# Altium schematic symbol library Regulator_Switching.SchLib: 1120 symbols (part 7 of 8) (continued)
## TPS61092 (continued)
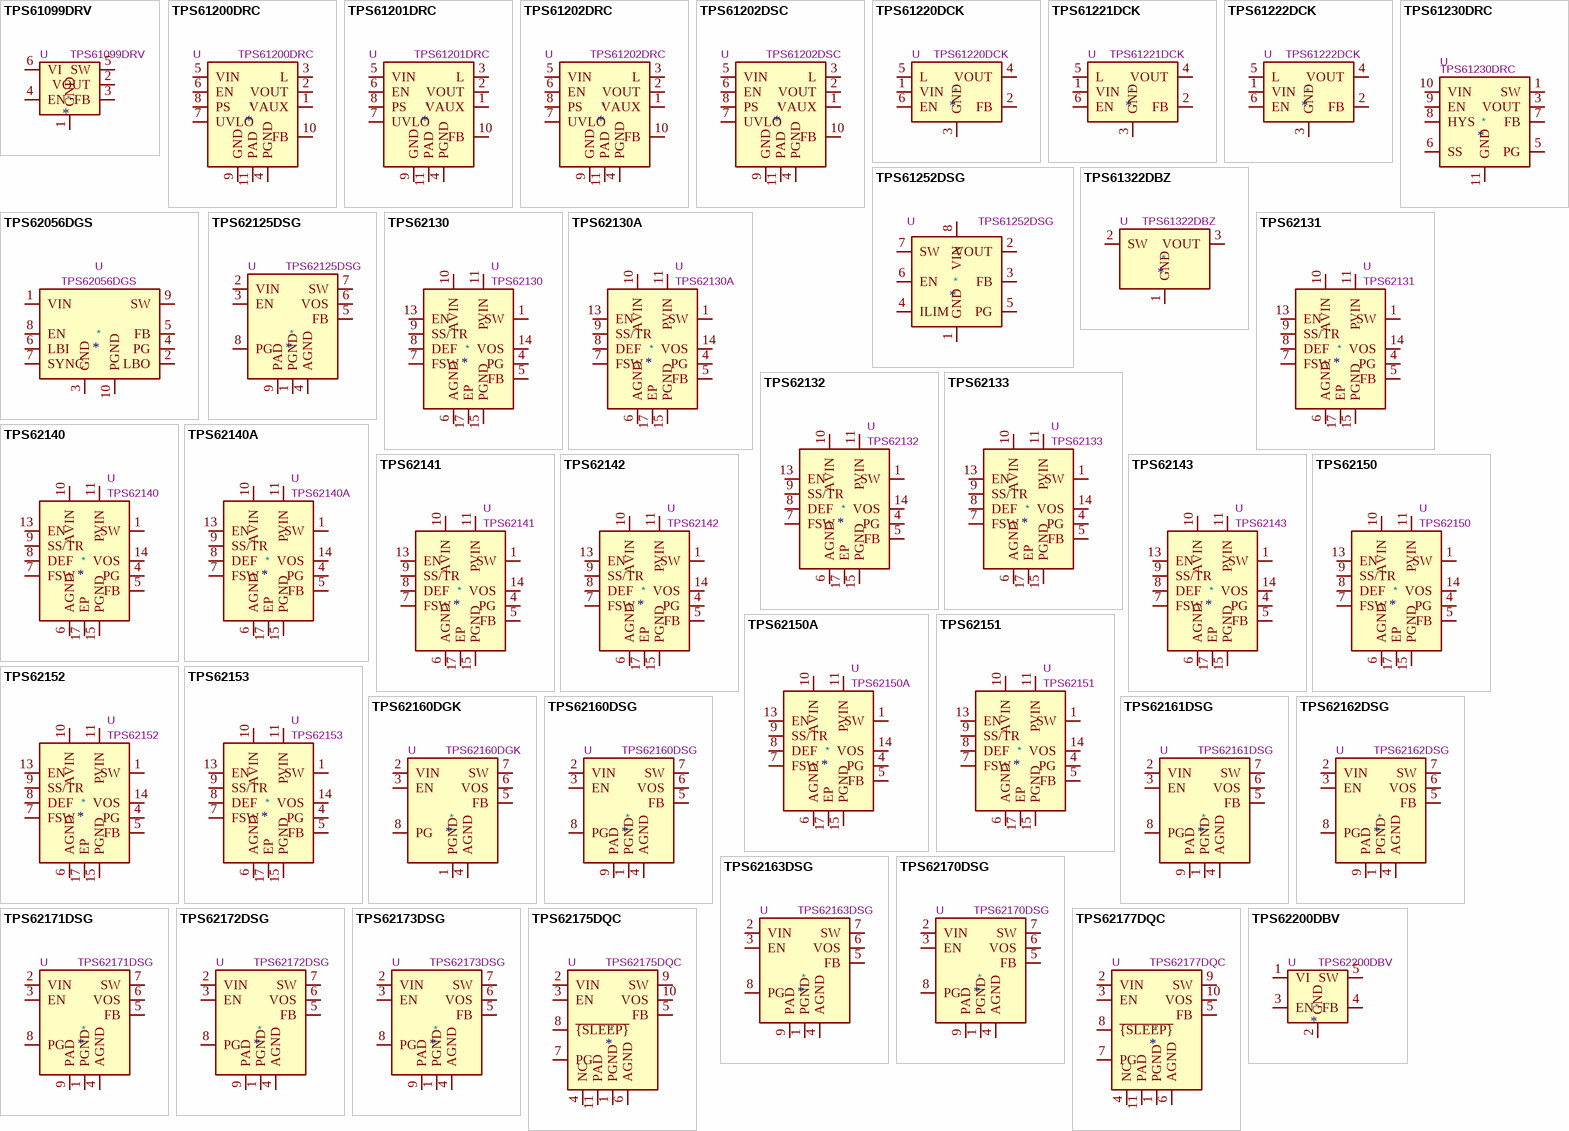
[diagram p25: symbols TPS61099DRV to TPS62200DBV]

## TPS61099DRV
designator *  value TPS61099DRV  Reference: U
ki_keywords: Step-Up DC-DC Converter; ki_description: Boost Converter, 0.7-5.5V Input Voltage, 1A Switch Current, Adjustable 1.8-5.5V Output Voltage, WSON-6; ki_fp_filters: WSON*1EP*2x2mm*P0.65mm*; Footprint: Package_SON:WSON-6-1EP_2x2mm_P0.65mm_EP1x1.6mm; Datasheet: https://www.ti.com/lit/gpn/TPS61099
pins: 1 GND, 2 VOUT, 3 FB, 4 EN, 5 SW, 6 VI, 7 GND hidden

## TPS61200DRC
designator *  value TPS61200DRC  Reference: U
ki_keywords: boost step-up DC/DC synchronous; ki_description: Low Input Voltage Synchronous Boost Converter With 1.3A Switches, Adjustable Output Voltage, 0.3-5.5V Input Voltage, VSON-10; ki_fp_filters: Texas*S*PVSON*N10*ThermalVias*; Footprint: Package_SON:Texas_S-PVSON-N10_ThermalVias; Datasheet: http://www.ti.com/lit/ds/symlink/tps61200.pdf
pins: 1 VAUX, 2 VOUT, 3 L, 4 PGND, 5 VIN, 6 EN, 7 UVLO, 8 PS, 9 GND, 10 FB, 11 PAD

## TPS61201DRC
designator *  value TPS61201DRC  Reference: U
ki_keywords: boost step-up DC/DC synchronous; ki_description: Low Input Voltage Synchronous Boost Converter With 1.3A Switches, Fixed 5V Output Voltage, 0.3-5.5V Input Voltage, VSON-10; ki_fp_filters: Texas*S*PVSON*N10*ThermalVias*; Footprint: Package_SON:Texas_S-PVSON-N10_ThermalVias; Datasheet: http://www.ti.com/lit/ds/symlink/tps61200.pdf
pins: 1 VAUX, 2 VOUT, 3 L, 4 PGND, 5 VIN, 6 EN, 7 UVLO, 8 PS, 9 GND, 10 FB, 11 PAD

## TPS61202DRC
designator *  value TPS61202DRC  Reference: U
ki_keywords: boost step-up DC/DC synchronous; ki_description: Low Input Voltage Synchronous Boost Converter With 1.3A Switches, Fixed 5V Output Voltage, 0.3-5.5V Input Voltage, VSON-10; ki_fp_filters: Texas*S*PVSON*N10*ThermalVias*; Footprint: Package_SON:Texas_S-PVSON-N10_ThermalVias; Datasheet: http://www.ti.com/lit/ds/symlink/tps61200.pdf
pins: 1 VAUX, 2 VOUT, 3 L, 4 PGND, 5 VIN, 6 EN, 7 UVLO, 8 PS, 9 GND, 10 FB, 11 PAD

## TPS61202DSC
designator *  value TPS61202DSC  Reference: U
ki_keywords: boost step-up DC/DC synchronous; ki_description: Low Input Voltage Synchronous Boost Converter With 1.3A Switches, Fixed 5V Output Voltage, 0.3-5.5V Input Voltage, WSON-10; ki_fp_filters: Texas*DSC0010J*ThermalVias*; Footprint: Package_SON:Texas_DSC0010J_ThermalVias; Datasheet: http://www.ti.com/lit/ds/symlink/tps61200.pdf
pins: 1 VAUX, 2 VOUT, 3 L, 4 PGND, 5 VIN, 6 EN, 7 UVLO, 8 PS, 9 GND, 10 FB, 11 PAD

## TPS61220DCK
designator *  value TPS61220DCK  Reference: U
ki_keywords: Boost adjustable converter; ki_description: 400 mA Step-Up Converter, Adjustable Output Voltage, 0.7-5.5V Input Voltage, SC-70; ki_fp_filters: Texas*R*PDSO*G6*; Footprint: Package_TO_SOT_SMD:Texas_R-PDSO-G6; Datasheet: http://www.ti.com/lit/ds/symlink/tps61220.pdf
pins: 1 VIN, 2 FB, 3 GND, 4 VOUT, 5 L, 6 EN

## TPS61221DCK
designator *  value TPS61221DCK  Reference: U
ki_keywords: Boost adjustable converter; ki_description: 400 mA Step-Up Converter, Fixed 3.3V Output Voltage, 0.7-5.5V Input Voltage, SC-70; ki_fp_filters: Texas*R*PDSO*G6*; Footprint: Package_TO_SOT_SMD:Texas_R-PDSO-G6; Datasheet: http://www.ti.com/lit/ds/symlink/tps61220.pdf
pins: 1 VIN, 2 FB, 3 GND, 4 VOUT, 5 L, 6 EN

## TPS61222DCK
designator *  value TPS61222DCK  Reference: U
ki_keywords: Boost adjustable converter; ki_description: 400 mA Step-Up Converter, Fixed 5V Output Voltage, 0.7-5.5V Input Voltage, SC-70; ki_fp_filters: Texas*R*PDSO*G6*; Footprint: Package_TO_SOT_SMD:Texas_R-PDSO-G6; Datasheet: http://www.ti.com/lit/ds/symlink/tps61220.pdf
pins: 1 VIN, 2 FB, 3 GND, 4 VOUT, 5 L, 6 EN

## TPS61230DRC
designator *  value TPS61230DRC  Reference: U
ki_keywords: boost converter switching adjustable 5A-switch VSON-10; ki_description: High Efficiency Synchronous Step Up Converters with 5-A Switches, 2.3-5.5V Input Voltage, VSON-10; ki_fp_filters: Texas*S*PVSON*N10*; Footprint: Package_SON:Texas_S-PVSON-N10_ThermalVias; Datasheet: http://www.ti.com/lit/ds/symlink/tps61232.pdf
pins: 1 SW, 2 SW hidden, 3 VOUT, 4 VOUT hidden, 5 PG, 6 SS, 7 FB, 8 HYS, 9 EN, 10 VIN, 11 GND

## TPS61252DSG
designator *  value TPS61252DSG  Reference: U
ki_keywords: boost converter switching; ki_description: Tiny 1.5-A Boost Converter With Adjustable Input Current Limit, 2.3-6.0V Vin, 3.0-6.5V Vout, WSON-8; ki_fp_filters: WSON*1EP*2x2mm*P0.5mm*; Footprint: Package_SON:WSON-8-1EP_2x2mm_P0.5mm_EP0.9x1.6mm; Datasheet: http://www.ti.com/lit/ds/symlink/tps61252.pdf
pins: 1 GND, 2 VOUT, 3 FB, 4 ILIM, 5 PG, 6 EN, 7 SW, 8 VIN, 9 GND hidden

## TPS61322DBZ
designator *  value TPS61322DBZ  Reference: U
ki_keywords: Boost converter; ki_description: 750mA Step-Up Converter, 2.2V Output Voltage, 0.9-5.5V Input Voltage, SOT-23; ki_fp_filters: SOT?23*; Footprint: Package_TO_SOT_SMD:SOT-23; Datasheet: http://www.ti.com/lit/ds/symlink/tps61322.pdf
pins: 1 GND, 2 SW, 3 VOUT

## TPS62056DGS
designator *  value TPS62056DGS  Reference: U
ki_keywords: voltage regulator switch mode step down; ki_description: 800 mA Step-Down Converter, Adjustable Output Voltage, 0.7-6V Input Voltage, VSSOP-10; ki_fp_filters: VSSOP*3x3mm*P0.5mm*; Footprint: Package_SO:VSSOP-10_3x3mm_P0.5mm; Datasheet: http://www.ti.com/lit/ds/symlink/tps62056.pdf
pins: 1 VIN, 2 LBO, 3 GND, 4 PG, 5 FB, 6 LBI, 7 SYNC, 8 EN, 9 SW, 10 PGND

## TPS62125DSG
designator *  value TPS62125DSG  Reference: U
ki_keywords: step-down dc-dc buck regulator; ki_description: 300mA Step-Down Converter with Enable Threshold and Hysteresis, adjustable output, 3-17V input voltage, WSON-8; ki_fp_filters: WSON*EP*2x2mm*P0.5mm*; Footprint: Package_SON:WSON-8-1EP_2x2mm_P0.5mm_EP0.9x1.6mm_ThermalVias; Datasheet: http://www.ti.com/lit/ds/symlink/tps62125.pdf
pins: 1 PGND, 2 VIN, 3 EN, 4 AGND, 5 FB, 6 VOS, 7 SW, 8 PG, 9 PAD

## TPS62130
designator *  value TPS62130  Reference: U
ki_keywords: step-down dcdc; ki_description: 3A Step-Down Converter with DCS-Control, Adjustable Output Voltage, 3-17V Input Voltage, QFN-16; ki_fp_filters: VQFN*1EP*3x3mm*P0.5mm*; Footprint: Package_DFN_QFN:VQFN-16-1EP_3x3mm_P0.5mm_EP1.68x1.68mm_ThermalVias; Datasheet: http://www.ti.com/lit/ds/symlink/tps62130.pdf
pins: 1 SW, 2 SW hidden, 3 SW hidden, 4 PG, 5 FB, 6 AGND, 7 FSW, 8 DEF, 9 SS/TR, 10 AVIN, 11 PVIN, 12 PVIN hidden, 13 EN, 14 VOS, 15 PGND, 16 PGND hidden, 17 EP

## TPS62130A
designator *  value TPS62130A  Reference: U
ki_keywords: step-down dcdc; ki_description: 3A Step-Down Converter with DCS-Control, Adjustable Output Voltage, 3-17V Input Voltage, PG=LOW in Power-Down, QFN-16; ki_fp_filters: VQFN*1EP*3x3mm*P0.5mm*; Footprint: Package_DFN_QFN:VQFN-16-1EP_3x3mm_P0.5mm_EP1.68x1.68mm_ThermalVias; Datasheet: http://www.ti.com/lit/ds/symlink/tps62130.pdf
pins: 1 SW, 2 SW hidden, 3 SW hidden, 4 PG, 5 FB, 6 AGND, 7 FSW, 8 DEF, 9 SS/TR, 10 AVIN, 11 PVIN, 12 PVIN hidden, 13 EN, 14 VOS, 15 PGND, 16 PGND hidden, 17 EP

## TPS62131
designator *  value TPS62131  Reference: U
ki_keywords: step-down dcdc; ki_description: 3A Step-Down Converter with DCS-Control, Fixed 1.8V Output Voltage, 3-17V Input Voltage, QFN-16; ki_fp_filters: VQFN*1EP*3x3mm*P0.5mm*; Footprint: Package_DFN_QFN:VQFN-16-1EP_3x3mm_P0.5mm_EP1.68x1.68mm_ThermalVias; Datasheet: http://www.ti.com/lit/ds/symlink/tps62130.pdf
pins: 1 SW, 2 SW hidden, 3 SW hidden, 4 PG, 5 FB, 6 AGND, 7 FSW, 8 DEF, 9 SS/TR, 10 AVIN, 11 PVIN, 12 PVIN hidden, 13 EN, 14 VOS, 15 PGND, 16 PGND hidden, 17 EP

## TPS62132
designator *  value TPS62132  Reference: U
ki_keywords: step-down dcdc; ki_description: 3A Step-Down Converter with DCS-Control, Fixed 3.3V Output Voltage, 3-17V Input Voltage, QFN-16; ki_fp_filters: VQFN*1EP*3x3mm*P0.5mm*; Footprint: Package_DFN_QFN:VQFN-16-1EP_3x3mm_P0.5mm_EP1.68x1.68mm_ThermalVias; Datasheet: http://www.ti.com/lit/ds/symlink/tps62130.pdf
pins: 1 SW, 2 SW hidden, 3 SW hidden, 4 PG, 5 FB, 6 AGND, 7 FSW, 8 DEF, 9 SS/TR, 10 AVIN, 11 PVIN, 12 PVIN hidden, 13 EN, 14 VOS, 15 PGND, 16 PGND hidden, 17 EP

## TPS62133
designator *  value TPS62133  Reference: U
ki_keywords: step-down dcdc; ki_description: 3A Step-Down Converter with DCS-Control, Fixed 5.0V Output Voltage, 3-17V Input Voltage, QFN-16; ki_fp_filters: VQFN*1EP*3x3mm*P0.5mm*; Footprint: Package_DFN_QFN:VQFN-16-1EP_3x3mm_P0.5mm_EP1.68x1.68mm_ThermalVias; Datasheet: http://www.ti.com/lit/ds/symlink/tps62130.pdf
pins: 1 SW, 2 SW hidden, 3 SW hidden, 4 PG, 5 FB, 6 AGND, 7 FSW, 8 DEF, 9 SS/TR, 10 AVIN, 11 PVIN, 12 PVIN hidden, 13 EN, 14 VOS, 15 PGND, 16 PGND hidden, 17 EP

## TPS62140
designator *  value TPS62140  Reference: U
ki_keywords: step-down dcdc; ki_description: 2A Step-Down Converter with DCS-Control, Adjustable Output Voltage, 3-17V Input Voltage, QFN-16; ki_fp_filters: VQFN*1EP*3x3mm*P0.5mm*; Footprint: Package_DFN_QFN:VQFN-16-1EP_3x3mm_P0.5mm_EP1.68x1.68mm_ThermalVias; Datasheet: http://www.ti.com/lit/ds/symlink/TPS62140.pdf
pins: 1 SW, 2 SW hidden, 3 SW hidden, 4 PG, 5 FB, 6 AGND, 7 FSW, 8 DEF, 9 SS/TR, 10 AVIN, 11 PVIN, 12 PVIN hidden, 13 EN, 14 VOS, 15 PGND, 16 PGND hidden, 17 EP

## TPS62140A
designator *  value TPS62140A  Reference: U
ki_keywords: step-down dcdc; ki_description: 2A Step-Down Converter with DCS-Control, Adjustable Output Voltage, 3-17V Input Voltage, PG=LOW in Power-Down, QFN-16; ki_fp_filters: VQFN*1EP*3x3mm*P0.5mm*; Footprint: Package_DFN_QFN:VQFN-16-1EP_3x3mm_P0.5mm_EP1.68x1.68mm_ThermalVias; Datasheet: http://www.ti.com/lit/ds/symlink/TPS62140.pdf
pins: 1 SW, 2 SW hidden, 3 SW hidden, 4 PG, 5 FB, 6 AGND, 7 FSW, 8 DEF, 9 SS/TR, 10 AVIN, 11 PVIN, 12 PVIN hidden, 13 EN, 14 VOS, 15 PGND, 16 PGND hidden, 17 EP

## TPS62141
designator *  value TPS62141  Reference: U
ki_keywords: step-down dcdc; ki_description: 2A Step-Down Converter with DCS-Control, Fixed 1.8V Output Voltage, 3-17V Input Voltage, QFN-16; ki_fp_filters: VQFN*1EP*3x3mm*P0.5mm*; Footprint: Package_DFN_QFN:VQFN-16-1EP_3x3mm_P0.5mm_EP1.68x1.68mm_ThermalVias; Datasheet: http://www.ti.com/lit/ds/symlink/TPS62140.pdf
pins: 1 SW, 2 SW hidden, 3 SW hidden, 4 PG, 5 FB, 6 AGND, 7 FSW, 8 DEF, 9 SS/TR, 10 AVIN, 11 PVIN, 12 PVIN hidden, 13 EN, 14 VOS, 15 PGND, 16 PGND hidden, 17 EP

## TPS62142
designator *  value TPS62142  Reference: U
ki_keywords: step-down dcdc; ki_description: 2A Step-Down Converter with DCS-Control, Fixed 3.3V Output Voltage, 3-17V Input Voltage, QFN-16; ki_fp_filters: VQFN*1EP*3x3mm*P0.5mm*; Footprint: Package_DFN_QFN:VQFN-16-1EP_3x3mm_P0.5mm_EP1.68x1.68mm_ThermalVias; Datasheet: http://www.ti.com/lit/ds/symlink/TPS62140.pdf
pins: 1 SW, 2 SW hidden, 3 SW hidden, 4 PG, 5 FB, 6 AGND, 7 FSW, 8 DEF, 9 SS/TR, 10 AVIN, 11 PVIN, 12 PVIN hidden, 13 EN, 14 VOS, 15 PGND, 16 PGND hidden, 17 EP

## TPS62143
designator *  value TPS62143  Reference: U
ki_keywords: step-down dcdc; ki_description: 2A Step-Down Converter with DCS-Control, Fixed 5.0V Output Voltage, 3-17V Input Voltage, QFN-16; ki_fp_filters: VQFN*1EP*3x3mm*P0.5mm*; Footprint: Package_DFN_QFN:VQFN-16-1EP_3x3mm_P0.5mm_EP1.68x1.68mm_ThermalVias; Datasheet: http://www.ti.com/lit/ds/symlink/TPS62140.pdf
pins: 1 SW, 2 SW hidden, 3 SW hidden, 4 PG, 5 FB, 6 AGND, 7 FSW, 8 DEF, 9 SS/TR, 10 AVIN, 11 PVIN, 12 PVIN hidden, 13 EN, 14 VOS, 15 PGND, 16 PGND hidden, 17 EP

## TPS62150
designator *  value TPS62150  Reference: U
ki_keywords: step-down dcdc; ki_description: 1A Step-Down Converter with DCS-Control, Adjustable Output Voltage, 3-17V Input Voltage, QFN-16; ki_fp_filters: VQFN*1EP*3x3mm*P0.5mm*; Footprint: Package_DFN_QFN:VQFN-16-1EP_3x3mm_P0.5mm_EP1.68x1.68mm_ThermalVias; Datasheet: http://www.ti.com/lit/ds/symlink/TPS62150.pdf
pins: 1 SW, 2 SW hidden, 3 SW hidden, 4 PG, 5 FB, 6 AGND, 7 FSW, 8 DEF, 9 SS/TR, 10 AVIN, 11 PVIN, 12 PVIN hidden, 13 EN, 14 VOS, 15 PGND, 16 PGND hidden, 17 EP

## TPS62150A
designator *  value TPS62150A  Reference: U
ki_keywords: step-down dcdc; ki_description: 1A Step-Down Converter with DCS-Control, Adjustable Output Voltage, 3-17V Input Voltage, PG=LOW in Power-Down, QFN-16; ki_fp_filters: VQFN*1EP*3x3mm*P0.5mm*; Footprint: Package_DFN_QFN:VQFN-16-1EP_3x3mm_P0.5mm_EP1.68x1.68mm_ThermalVias; Datasheet: http://www.ti.com/lit/ds/symlink/TPS62150.pdf
pins: 1 SW, 2 SW hidden, 3 SW hidden, 4 PG, 5 FB, 6 AGND, 7 FSW, 8 DEF, 9 SS/TR, 10 AVIN, 11 PVIN, 12 PVIN hidden, 13 EN, 14 VOS, 15 PGND, 16 PGND hidden, 17 EP

## TPS62151
designator *  value TPS62151  Reference: U
ki_keywords: step-down dcdc; ki_description: 1A Step-Down Converter with DCS-Control, Fixed 1.8V Output Voltage, 3-17V Input Voltage, QFN-16; ki_fp_filters: VQFN*1EP*3x3mm*P0.5mm*; Footprint: Package_DFN_QFN:VQFN-16-1EP_3x3mm_P0.5mm_EP1.68x1.68mm_ThermalVias; Datasheet: http://www.ti.com/lit/ds/symlink/TPS62150.pdf
pins: 1 SW, 2 SW hidden, 3 SW hidden, 4 PG, 5 FB, 6 AGND, 7 FSW, 8 DEF, 9 SS/TR, 10 AVIN, 11 PVIN, 12 PVIN hidden, 13 EN, 14 VOS, 15 PGND, 16 PGND hidden, 17 EP

## TPS62152
designator *  value TPS62152  Reference: U
ki_keywords: step-down dcdc; ki_description: 1A Step-Down Converter with DCS-Control, Fixed 3.3V Output Voltage, 3-17V Input Voltage, QFN-16; ki_fp_filters: VQFN*1EP*3x3mm*P0.5mm*; Footprint: Package_DFN_QFN:VQFN-16-1EP_3x3mm_P0.5mm_EP1.68x1.68mm_ThermalVias; Datasheet: http://www.ti.com/lit/ds/symlink/TPS62150.pdf
pins: 1 SW, 2 SW hidden, 3 SW hidden, 4 PG, 5 FB, 6 AGND, 7 FSW, 8 DEF, 9 SS/TR, 10 AVIN, 11 PVIN, 12 PVIN hidden, 13 EN, 14 VOS, 15 PGND, 16 PGND hidden, 17 EP

## TPS62153
designator *  value TPS62153  Reference: U
ki_keywords: step-down dcdc; ki_description: 1A Step-Down Converter with DCS-Control, Fixed 5.0V Output Voltage, 3-17V Input Voltage, QFN-16; ki_fp_filters: VQFN*1EP*3x3mm*P0.5mm*; Footprint: Package_DFN_QFN:VQFN-16-1EP_3x3mm_P0.5mm_EP1.68x1.68mm_ThermalVias; Datasheet: http://www.ti.com/lit/ds/symlink/TPS62150.pdf
pins: 1 SW, 2 SW hidden, 3 SW hidden, 4 PG, 5 FB, 6 AGND, 7 FSW, 8 DEF, 9 SS/TR, 10 AVIN, 11 PVIN, 12 PVIN hidden, 13 EN, 14 VOS, 15 PGND, 16 PGND hidden, 17 EP

## TPS62160DGK
designator *  value TPS62160DGK  Reference: U
ki_keywords: step-down dc-dc buck regulator; ki_description: 1A Step-Down Converter with DCS-Control, adjustable output, 3-17V input voltage, VSSOP-8; ki_fp_filters: MSOP*3x3mm*P0.65mm*; Footprint: Package_SO:MSOP-8_3x3mm_P0.65mm; Datasheet: http://www.ti.com/lit/ds/symlink/tps62160.pdf
pins: 1 PGND, 2 VIN, 3 EN, 4 AGND, 5 FB, 6 VOS, 7 SW, 8 PG

## TPS62160DSG
designator *  value TPS62160DSG  Reference: U
ki_keywords: step-down dc-dc buck regulator; ki_description: 1A Step-Down Converter with DCS-Control, adjustable output, 3-17V input voltage, WSON-8; ki_fp_filters: WSON*EP*2x2mm*P0.5mm*; Footprint: Package_SON:WSON-8-1EP_2x2mm_P0.5mm_EP0.9x1.6mm_ThermalVias; Datasheet: http://www.ti.com/lit/ds/symlink/tps62160.pdf
pins: 1 PGND, 2 VIN, 3 EN, 4 AGND, 5 FB, 6 VOS, 7 SW, 8 PG, 9 PAD

## TPS62161DSG
designator *  value TPS62161DSG  Reference: U
ki_keywords: step-down dc-dc buck regulator; ki_description: 1A Step-Down Converter with DCS-Control, fixed 1.8V output, 3-17V input voltage, WSON-8; ki_fp_filters: WSON*EP*2x2mm*P0.5mm*; Footprint: Package_SON:WSON-8-1EP_2x2mm_P0.5mm_EP0.9x1.6mm_ThermalVias; Datasheet: http://www.ti.com/lit/ds/symlink/tps62160.pdf
pins: 1 PGND, 2 VIN, 3 EN, 4 AGND, 5 FB, 6 VOS, 7 SW, 8 PG, 9 PAD

## TPS62162DSG
designator *  value TPS62162DSG  Reference: U
ki_keywords: step-down dc-dc buck regulator; ki_description: 1A Step-Down Converter with DCS-Control, fixed 3.3V output, 3-17V input voltage, WSON-8; ki_fp_filters: WSON*EP*2x2mm*P0.5mm*; Footprint: Package_SON:WSON-8-1EP_2x2mm_P0.5mm_EP0.9x1.6mm_ThermalVias; Datasheet: http://www.ti.com/lit/ds/symlink/tps62160.pdf
pins: 1 PGND, 2 VIN, 3 EN, 4 AGND, 5 FB, 6 VOS, 7 SW, 8 PG, 9 PAD

## TPS62163DSG
designator *  value TPS62163DSG  Reference: U
ki_keywords: step-down dc-dc buck regulator; ki_description: 1A Step-Down Converter with DCS-Control, fixed 5.0V output, 3-17V input voltage, WSON-8; ki_fp_filters: WSON*EP*2x2mm*P0.5mm*; Footprint: Package_SON:WSON-8-1EP_2x2mm_P0.5mm_EP0.9x1.6mm_ThermalVias; Datasheet: http://www.ti.com/lit/ds/symlink/tps62160.pdf
pins: 1 PGND, 2 VIN, 3 EN, 4 AGND, 5 FB, 6 VOS, 7 SW, 8 PG, 9 PAD

## TPS62170DSG
designator *  value TPS62170DSG  Reference: U
ki_keywords: step-down dc-dc buck regulator; ki_description: 500mA Step-Down Converter with DCS-Control, adjustable output, 3-17V input voltage, WSON-8; ki_fp_filters: WSON*EP*2x2mm*P0.5mm*; Footprint: Package_SON:WSON-8-1EP_2x2mm_P0.5mm_EP0.9x1.6mm_ThermalVias; Datasheet: http://www.ti.com/lit/ds/symlink/tps62170.pdf
pins: 1 PGND, 2 VIN, 3 EN, 4 AGND, 5 FB, 6 VOS, 7 SW, 8 PG, 9 PAD

## TPS62171DSG
designator *  value TPS62171DSG  Reference: U
ki_keywords: step-down dc-dc buck regulator; ki_description: 500mA Step-Down Converter with DCS-Control, fixed 1.8V output, 3-17V input voltage, WSON-8; ki_fp_filters: WSON*EP*2x2mm*P0.5mm*; Footprint: Package_SON:WSON-8-1EP_2x2mm_P0.5mm_EP0.9x1.6mm_ThermalVias; Datasheet: http://www.ti.com/lit/ds/symlink/tps62170.pdf
pins: 1 PGND, 2 VIN, 3 EN, 4 AGND, 5 FB, 6 VOS, 7 SW, 8 PG, 9 PAD

## TPS62172DSG
designator *  value TPS62172DSG  Reference: U
ki_keywords: step-down dc-dc buck regulator; ki_description: 500mA Step-Down Converter with DCS-Control, fixed 3.3V output, 3-17V input voltage, WSON-8; ki_fp_filters: WSON*EP*2x2mm*P0.5mm*; Footprint: Package_SON:WSON-8-1EP_2x2mm_P0.5mm_EP0.9x1.6mm_ThermalVias; Datasheet: http://www.ti.com/lit/ds/symlink/tps62170.pdf
pins: 1 PGND, 2 VIN, 3 EN, 4 AGND, 5 FB, 6 VOS, 7 SW, 8 PG, 9 PAD

## TPS62173DSG
designator *  value TPS62173DSG  Reference: U
ki_keywords: step-down dc-dc buck regulator; ki_description: 500mA Step-Down Converter with DCS-Control, fixed 5.0V output, 3-17V input voltage, WSON-8; ki_fp_filters: WSON*EP*2x2mm*P0.5mm*; Footprint: Package_SON:WSON-8-1EP_2x2mm_P0.5mm_EP0.9x1.6mm_ThermalVias; Datasheet: http://www.ti.com/lit/ds/symlink/tps62170.pdf
pins: 1 PGND, 2 VIN, 3 EN, 4 AGND, 5 FB, 6 VOS, 7 SW, 8 PG, 9 PAD

## TPS62175DQC
designator *  value TPS62175DQC  Reference: U
ki_keywords: step-down dc-dc buck regulator; ki_description: 500mA Step-Down Converter with Sleep Mode, adjustable Output Voltage, 4.75-28V input voltage, WSON-10; ki_fp_filters: WSON*EP*2x3mm*P0.5mm*; Footprint: Package_SON:WSON-10-1EP_2x3mm_P0.5mm_EP0.84x2.4mm_ThermalVias; Datasheet: http://www.ti.com/lit/ds/symlink/tps62177.pdf
pins: 1 PGND, 2 VIN, 3 EN, 4 NC, 5 FB, 6 AGND, 7 PG, 8 ~{{SLEEP}}, 9 SW, 10 VOS, 11 PAD

## TPS62177DQC
designator *  value TPS62177DQC  Reference: U
ki_keywords: step-down dc-dc buck regulator; ki_description: 500mA Step-Down Converter with Sleep Mode, fixed 3.3V Output Voltage, 4.75-28V input voltage, WSON-10; ki_fp_filters: WSON*EP*2x3mm*P0.5mm*; Footprint: Package_SON:WSON-10-1EP_2x3mm_P0.5mm_EP0.84x2.4mm_ThermalVias; Datasheet: http://www.ti.com/lit/ds/symlink/tps62177.pdf
pins: 1 PGND, 2 VIN, 3 EN, 4 NC, 5 FB, 6 AGND, 7 PG, 8 ~{{SLEEP}}, 9 SW, 10 VOS, 11 PAD

## TPS62200DBV
designator *  value TPS62200DBV  Reference: U
ki_keywords: Step-Down DC-DC Converter; ki_description: 300mA High-Efficiency Step-Down DC-DC Converter, adjustable output voltage, 2.5-6V input voltage, SOT-23-5; ki_fp_filters: SOT?23*; Footprint: Package_TO_SOT_SMD:SOT-23-5; Datasheet: http://www.ti.com/lit/ds/symlink/tps62201.pdf
pins: 1 VI, 2 GND, 3 EN, 4 FB, 5 SW

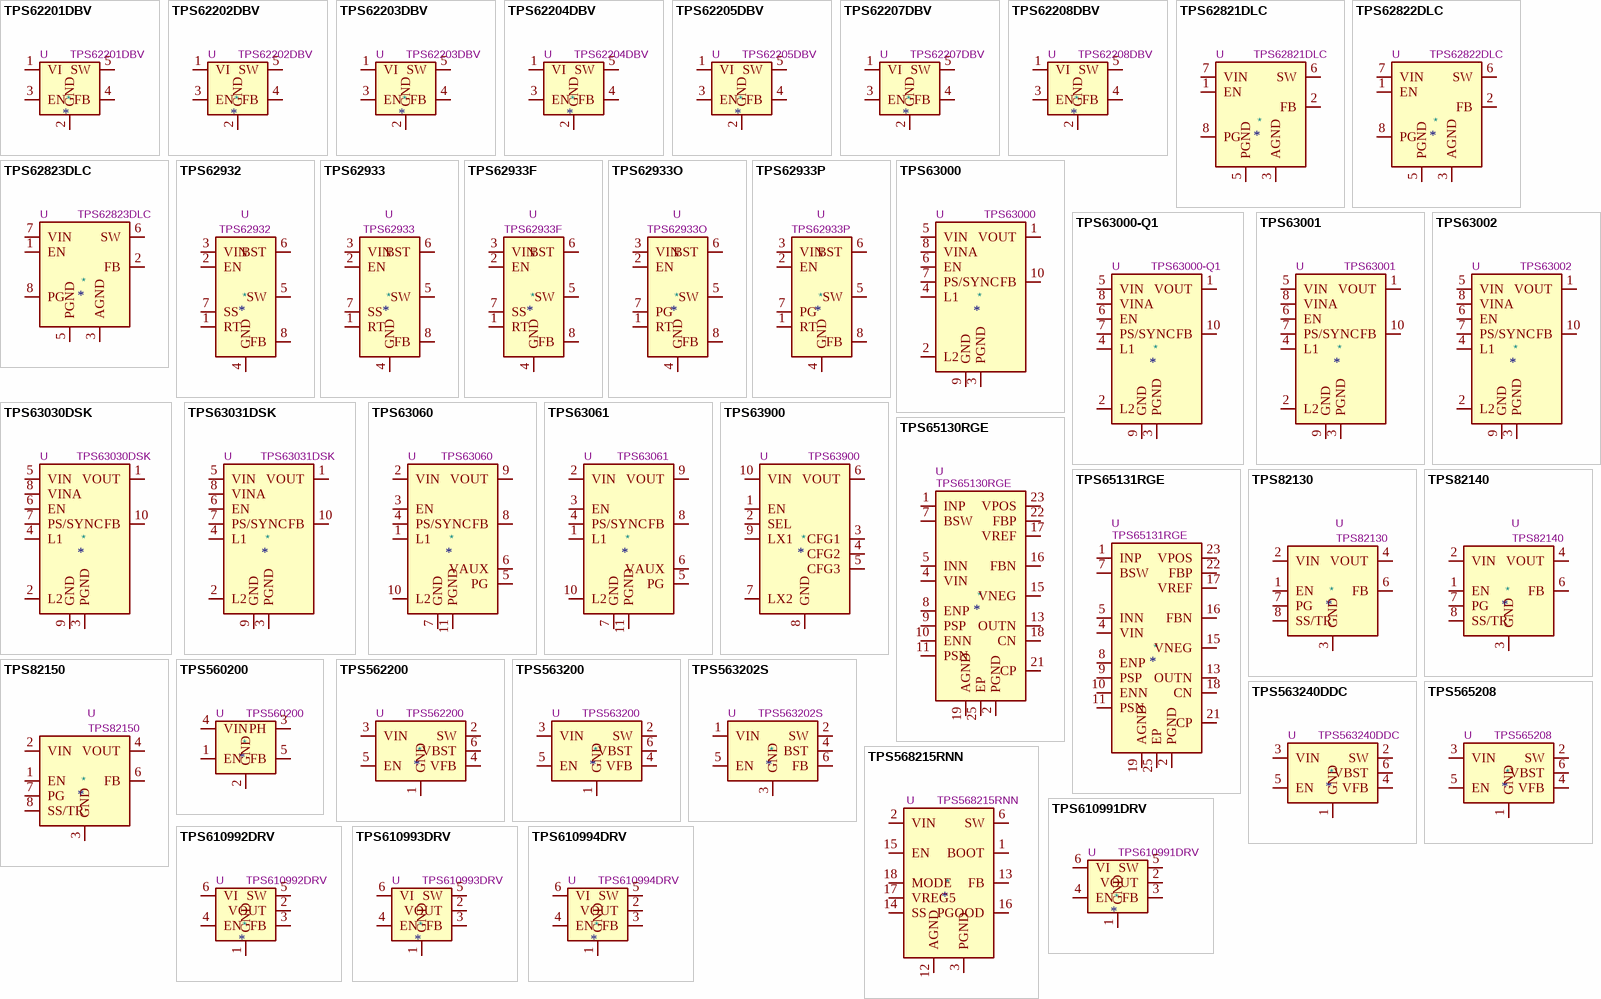
[diagram p26: symbols TPS62201DBV to TPS610994DRV]

## TPS62201DBV
designator *  value TPS62201DBV  Reference: U
ki_keywords: Step-Down DC-DC Converter; ki_description: 300mA High-Efficiency Step-Down DC-DC Converter, fixed 1.5V output voltage, 2.5-6V input voltage, SOT-23-5; ki_fp_filters: SOT?23*; Footprint: Package_TO_SOT_SMD:SOT-23-5; Datasheet: http://www.ti.com/lit/ds/symlink/tps62201.pdf
pins: 1 VI, 2 GND, 3 EN, 4 FB, 5 SW

## TPS62202DBV
designator *  value TPS62202DBV  Reference: U
ki_keywords: Step-Down DC-DC Converter; ki_description: 300mA High-Efficiency Step-Down DC-DC Converter, fixed 1.8V output voltage, 2.5-6V input voltage, SOT-23-5; ki_fp_filters: SOT?23*; Footprint: Package_TO_SOT_SMD:SOT-23-5; Datasheet: http://www.ti.com/lit/ds/symlink/tps62201.pdf
pins: 1 VI, 2 GND, 3 EN, 4 FB, 5 SW

## TPS62203DBV
designator *  value TPS62203DBV  Reference: U
ki_keywords: Step-Down DC-DC Converter; ki_description: 300mA High-Efficiency Step-Down DC-DC Converter, fixed 3.3V output voltage, 2.5-6V input voltage, SOT-23-5; ki_fp_filters: SOT?23*; Footprint: Package_TO_SOT_SMD:SOT-23-5; Datasheet: http://www.ti.com/lit/ds/symlink/tps62201.pdf
pins: 1 VI, 2 GND, 3 EN, 4 FB, 5 SW

## TPS62204DBV
designator *  value TPS62204DBV  Reference: U
ki_keywords: Step-Down DC-DC Converter; ki_description: 300mA High-Efficiency Step-Down DC-DC Converter, fixed 1.6V output voltage, 2.5-6V input voltage, SOT-23-5; ki_fp_filters: SOT?23*; Footprint: Package_TO_SOT_SMD:SOT-23-5; Datasheet: http://www.ti.com/lit/ds/symlink/tps62201.pdf
pins: 1 VI, 2 GND, 3 EN, 4 FB, 5 SW

## TPS62205DBV
designator *  value TPS62205DBV  Reference: U
ki_keywords: Step-Down DC-DC Converter; ki_description: 300mA High-Efficiency Step-Down DC-DC Converter, fixed 2.5V output voltage, 2.5-6V input voltage, SOT-23-5; ki_fp_filters: SOT?23*; Footprint: Package_TO_SOT_SMD:SOT-23-5; Datasheet: http://www.ti.com/lit/ds/symlink/tps62201.pdf
pins: 1 VI, 2 GND, 3 EN, 4 FB, 5 SW

## TPS62207DBV
designator *  value TPS62207DBV  Reference: U
ki_keywords: Step-Down DC-DC Converter; ki_description: 300mA High-Efficiency Step-Down DC-DC Converter, fixed 1.2V output voltage, 2.5-6V input voltage, SOT-23-5; ki_fp_filters: SOT?23*; Footprint: Package_TO_SOT_SMD:SOT-23-5; Datasheet: http://www.ti.com/lit/ds/symlink/tps62201.pdf
pins: 1 VI, 2 GND, 3 EN, 4 FB, 5 SW

## TPS62208DBV
designator *  value TPS62208DBV  Reference: U
ki_keywords: Step-Down DC-DC Converter; ki_description: 300mA High-Efficiency Step-Down DC-DC Converter, fixed 1.875V output voltage, 2.5-6V input voltage, SOT-23-5; ki_fp_filters: SOT?23*; Footprint: Package_TO_SOT_SMD:SOT-23-5; Datasheet: http://www.ti.com/lit/ds/symlink/tps62201.pdf
pins: 1 VI, 2 GND, 3 EN, 4 FB, 5 SW

## TPS62821DLC
designator *  value TPS62821DLC  Reference: U
ki_keywords: step-down dc-dc buck regulator; ki_description: 1A Step-Down Converter with DCS-Control, adjustable output, 2.4-5.5V input voltage, QFN-8; ki_fp_filters: Texas*VSON*HR*1.5x2mm*P0.5mm*; Footprint: Package_DFN_QFN:Texas_VSON-HR-8_1.5x2mm_P0.5mm; Datasheet: http://www.ti.com/lit/ds/symlink/tps62823.pdf
pins: 1 EN, 2 FB, 3 AGND, 4 NC hidden, 5 PGND, 6 SW, 7 VIN, 8 PG

## TPS62822DLC
designator *  value TPS62822DLC  Reference: U
ki_keywords: step-down dc-dc buck regulator; ki_description: 2A Step-Down Converter with DCS-Control, adjustable output, 2.4-5.5V input voltage, QFN-8; ki_fp_filters: Texas*VSON*HR*1.5x2mm*P0.5mm*; Footprint: Package_DFN_QFN:Texas_VSON-HR-8_1.5x2mm_P0.5mm; Datasheet: http://www.ti.com/lit/ds/symlink/tps62823.pdf
pins: 1 EN, 2 FB, 3 AGND, 4 NC hidden, 5 PGND, 6 SW, 7 VIN, 8 PG

## TPS62823DLC
designator *  value TPS62823DLC  Reference: U
ki_keywords: step-down dc-dc buck regulator; ki_description: 3A Step-Down Converter with DCS-Control, adjustable output, 2.4-5.5V input voltage, QFN-8; ki_fp_filters: Texas*VSON*HR*1.5x2mm*P0.5mm*; Footprint: Package_DFN_QFN:Texas_VSON-HR-8_1.5x2mm_P0.5mm; Datasheet: http://www.ti.com/lit/ds/symlink/tps62823.pdf
pins: 1 EN, 2 FB, 3 AGND, 4 NC hidden, 5 PGND, 6 SW, 7 VIN, 8 PG

## TPS62932
designator *  value TPS62932  Reference: U
ki_keywords: synchronous buck converter pulse frequency modulation; ki_description: 3.8-30V, 2A  Synchronous Buck Converters with pulse frequency modulation (PFM), SOT583-8; ki_fp_filters: SOT?583*; Footprint: Package_TO_SOT_SMD:SOT-583-8; Datasheet: https://www.ti.com/lit/ds/symlink/tps62933.pdf
pins: 1 RT, 2 EN, 3 VIN, 4 GND, 5 SW, 6 BST, 7 SS, 8 FB

## TPS62933
designator *  value TPS62933  Reference: U
ki_keywords: synchronous buck converter pulse frequency modulation; ki_description: 3.8-30V, 3A Synchronous Buck Converters with pulse frequency modulation (PFM), SOT583-8; ki_fp_filters: SOT?583*; Footprint: Package_TO_SOT_SMD:SOT-583-8; Datasheet: https://www.ti.com/lit/ds/symlink/tps62933.pdf
pins: 1 RT, 2 EN, 3 VIN, 4 GND, 5 SW, 6 BST, 7 SS, 8 FB

## TPS62933F
designator *  value TPS62933F  Reference: U
ki_keywords: synchronous buck converter forced continuous conduction mode; ki_description: 3.8-30V, 3A Synchronous Buck Converters with forced continuous conduction mode (FCCM), SOT583-8; ki_fp_filters: SOT?583*; Footprint: Package_TO_SOT_SMD:SOT-583-8; Datasheet: https://www.ti.com/lit/ds/symlink/tps62933.pdf
pins: 1 RT, 2 EN, 3 VIN, 4 GND, 5 SW, 6 BST, 7 SS, 8 FB

## TPS62933O
designator *  value TPS62933O  Reference: U
ki_keywords: synchronous buck converter out of audio power good; ki_description: 3.8-30V, 3A Synchronous Buck Converters with out of audio (OOA) mode and power good, SOT583-8; ki_fp_filters: SOT?583*; Footprint: Package_TO_SOT_SMD:SOT-583-8; Datasheet: https://www.ti.com/lit/ds/symlink/tps62933.pdf
pins: 1 RT, 2 EN, 3 VIN, 4 GND, 5 SW, 6 BST, 7 PG, 8 FB

## TPS62933P
designator *  value TPS62933P  Reference: U
ki_keywords: synchronous buck converter pulse frequency modulation power good; ki_description: 3.8-30V, 3A Synchronous Buck Converters with pulse frequency modulation (PFM) and power good, SOT583-8; ki_fp_filters: SOT?583*; Footprint: Package_TO_SOT_SMD:SOT-583-8; Datasheet: https://www.ti.com/lit/ds/symlink/tps62933.pdf
pins: 1 RT, 2 EN, 3 VIN, 4 GND, 5 SW, 6 BST, 7 PG, 8 FB

## TPS63000
designator *  value TPS63000  Reference: U
ki_keywords: Buck-Boost adjustable converter; ki_description: Buck-Boost Converter, 1.8-5.5V Input Voltage, 1.8A Switch Current, Adjustable 1.2-5.5V Output Voltage, VSON-10; ki_fp_filters: Texas*DRC0010J*; Footprint: Package_SON:Texas_DRC0010J_ThermalVias; Datasheet: http://www.ti.com/lit/ds/symlink/tps63000.pdf
pins: 1 VOUT, 2 L2, 3 PGND, 4 L1, 5 VIN, 6 EN, 7 PS/SYNC, 8 VINA, 9 GND, 10 FB, 11 PGND hidden

## TPS63000-Q1
designator *  value TPS63000-Q1  Reference: U
ki_keywords: Buck-Boost adjustable converter; ki_description: Buck-Boost Converter, 1.8-5.5V Input Voltage, 1.8A Switch Current, Adjustable 1.2-5.5V Output Voltage, Automotive, VSON-10; ki_fp_filters: Texas*DRC0010J*; Footprint: Package_SON:Texas_DRC0010J_ThermalVias; Datasheet: http://www.ti.com/lit/ds/symlink/tps63000-q1.pdf
pins: 1 VOUT, 2 L2, 3 PGND, 4 L1, 5 VIN, 6 EN, 7 PS/SYNC, 8 VINA, 9 GND, 10 FB, 11 PGND hidden

## TPS63001
designator *  value TPS63001  Reference: U
ki_keywords: Buck-Boost fixed 3.3V converter; ki_description: Buck-Boost Converter, 1.8-5.5V Input Voltage, 1.7A Switch Current, 3.3V Output Voltage, VSON-10; ki_fp_filters: Texas*DRC0010J*; Footprint: Package_SON:Texas_DRC0010J_ThermalVias; Datasheet: http://www.ti.com/lit/ds/symlink/tps63000.pdf
pins: 1 VOUT, 2 L2, 3 PGND, 4 L1, 5 VIN, 6 EN, 7 PS/SYNC, 8 VINA, 9 GND, 10 FB, 11 PGND hidden

## TPS63002
designator *  value TPS63002  Reference: U
ki_keywords: Buck-Boost fixed 5V converter; ki_description: Buck-Boost Converter, 1.8-5.5V Input Voltage, 1.7A Switch Current, 5V Output Voltage, VSON-10; ki_fp_filters: Texas*DRC0010J*; Footprint: Package_SON:Texas_DRC0010J_ThermalVias; Datasheet: http://www.ti.com/lit/ds/symlink/tps63000.pdf
pins: 1 VOUT, 2 L2, 3 PGND, 4 L1, 5 VIN, 6 EN, 7 PS/SYNC, 8 VINA, 9 GND, 10 FB, 11 PGND hidden

## TPS63030DSK
designator *  value TPS63030DSK  Reference: U
ki_keywords: Buck-Boost adjustable converter; ki_description: Buck-Boost Converter, 1.8-5.5V Input Voltage, 1A Switch Current, Adjustable Output Voltage, VSON-10 (DSK0010A); ki_fp_filters: WSON*1EP*2.5x2.5mm*P0.5mm*EP1.2x2mm*; Footprint: Package_SON:WSON-10-1EP_2.5x2.5mm_P0.5mm_EP1.2x2mm; Datasheet: http://www.ti.com/lit/ds/symlink/tps63030.pdf
pins: 1 VOUT, 2 L2, 3 PGND, 4 L1, 5 VIN, 6 EN, 7 PS/SYNC, 8 VINA, 9 GND, 10 FB, 11 PGND hidden

## TPS63031DSK
designator *  value TPS63031DSK  Reference: U
ki_keywords: Buck-Boost fixed 3.3V converter; ki_description: Buck-Boost Converter, 1.8-5.5V Input Voltage, 1A Switch Current, 3.3V Output Voltage, VSON-10 (DSK0010A); ki_fp_filters: WSON*1EP*2.5x2.5mm*P0.5mm*EP1.2x2mm*; Footprint: Package_SON:WSON-10-1EP_2.5x2.5mm_P0.5mm_EP1.2x2mm; Datasheet: http://www.ti.com/lit/ds/symlink/tps63031.pdf
pins: 1 VOUT, 2 L2, 3 PGND, 4 L1, 5 VIN, 6 EN, 7 PS/SYNC, 8 VINA, 9 GND, 10 FB, 11 PGND hidden

## TPS63060
designator *  value TPS63060  Reference: U
ki_keywords: Buck-Boost adjustable converter; ki_description: Buck-Boost Converter, 2.5-12V Input Voltage, 2-A Switch Current, Adjustable 2.5-8V Output Voltage, S-PWSON-N10; ki_fp_filters: Texas*S*PWSON*N10*; Footprint: Package_SON:Texas_S-PWSON-N10_ThermalVias; Datasheet: http://www.ti.com/lit/ds/symlink/tps63060.pdf
pins: 1 L1, 2 VIN, 3 EN, 4 PS/SYNC, 5 PG, 6 VAUX, 7 GND, 8 FB, 9 VOUT, 10 L2, 11 PGND

## TPS63061
designator *  value TPS63061  Reference: U
ki_keywords: Buck-Boost converter 5V; ki_description: Buck-Boost Converter, 2.5-12V Input Voltage, 2-A Switch Current, Fixed 5V Output Voltage, S-PWSON-10; ki_fp_filters: Texas*S*PWSON*N10*; Footprint: Package_SON:Texas_S-PWSON-N10_ThermalVias; Datasheet: http://www.ti.com/lit/ds/symlink/tps63060.pdf
pins: 1 L1, 2 VIN, 3 EN, 4 PS/SYNC, 5 PG, 6 VAUX, 7 GND, 8 FB, 9 VOUT, 10 L2, 11 PGND

## TPS63900
designator *  value TPS63900  Reference: U
ki_keywords: Buck-Boost adjustable converter; ki_description: Buck-Boost Converter, 1.8-5.5V Input Voltage, 0.4A Switch Current, Adjustable 1.8-5V Output Voltage, WSON-10; ki_fp_filters: WSON*10*1EP*2.5x2.5*P0.5*; Footprint: Package_SON:WSON-10-1EP_2.5x2.5mm_P0.5mm_EP1.2x2mm_ThermalVias; Datasheet: https://www.ti.com/lit/ds/symlink/tps63900.pdf
pins: 1 EN, 2 SEL, 3 CFG1, 4 CFG2, 5 CFG3, 6 VOUT, 7 LX2, 8 GND, 9 LX1, 10 VIN, 11 GND hidden

## TPS65130RGE
designator *  value TPS65130RGE  Reference: U
ki_keywords: split-rail switching dual positive negative; ki_description: Split-Rail Converter with Dual, Positive and Negative Outputs (300mA typ, Switch Current Limit 800mA typ), 2.7-5.5V, VQFN-24; ki_fp_filters: VQFN*1EP*4x4mm*P0.5mm*; Footprint: Package_DFN_QFN:VQFN-24-1EP_4x4mm_P0.5mm_EP2.45x2.45mm_ThermalVias; Datasheet: http://www.ti.com/lit/ds/symlink/tps65130.pdf
pins: 1 INP, 2 PGND, 3 PGND hidden, 4 VIN, 5 INN, 6 INN hidden, 7 BSW, 8 ENP, 9 PSP, 10 ENN, 11 PSN, 12 NC hidden, 13 OUTN, 14 OUTN hidden, 15 VNEG, 16 FBN, 17 VREF, 18 CN, 19 AGND, 20 NC hidden, 21 CP, 22 FBP, 23 VPOS, 24 INP hidden, 25 EP

## TPS65131RGE
designator *  value TPS65131RGE  Reference: U
ki_keywords: split-rail switching dual positive negative; ki_description: Split-Rail Converter with Dual, Positive and Negative Outputs (750mA typ, Switch Current Limit 1950mA typ),), 2.7-5.5V, VQFN-24; ki_fp_filters: VQFN*1EP*4x4mm*P0.5mm*; Footprint: Package_DFN_QFN:VQFN-24-1EP_4x4mm_P0.5mm_EP2.45x2.45mm_ThermalVias; Datasheet: http://www.ti.com/lit/ds/symlink/tps65130.pdf
pins: 1 INP, 2 PGND, 3 PGND hidden, 4 VIN, 5 INN, 6 INN hidden, 7 BSW, 8 ENP, 9 PSP, 10 ENN, 11 PSN, 12 NC hidden, 13 OUTN, 14 OUTN hidden, 15 VNEG, 16 FBN, 17 VREF, 18 CN, 19 AGND, 20 NC hidden, 21 CP, 22 FBP, 23 VPOS, 24 INP hidden, 25 EP

## TPS82130
designator *  value TPS82130  Reference: U
ki_keywords: 17V 3A Step-down Buck Module; ki_description: 17V Input 3A Step-Down Converter MicroSiP Module with Integrated Inductor, μSiL-8; ki_fp_filters: Texas*MicroSiP*1EP*2.8x3mm*P0.65mm*; Footprint: Package_LGA:Texas_SIL0008D_MicroSiP-8-1EP_2.8x3mm_P0.65mm_EP1.1x1.9mm_ThermalVias; Datasheet: http://www.ti.com/lit/ds/symlink/tps82130.pdf
pins: 1 EN, 2 VIN, 3 GND, 4 VOUT, 5 VOUT hidden, 6 FB, 7 PG, 8 SS/TR, 9 GND hidden

## TPS82140
designator *  value TPS82140  Reference: U
ki_keywords: 17V 2A Step-down Buck Module; ki_description: 17V Input 2A Step-Down Converter MicroSiP Module with Integrated Inductor, μSiL-8; ki_fp_filters: Texas*MicroSiP*1EP*2.8x3mm*P0.65mm*; Footprint: Package_LGA:Texas_SIL0008D_MicroSiP-8-1EP_2.8x3mm_P0.65mm_EP1.1x1.9mm_ThermalVias; Datasheet: http://www.ti.com/lit/ds/symlink/tps82140.pdf
pins: 1 EN, 2 VIN, 3 GND, 4 VOUT, 5 VOUT hidden, 6 FB, 7 PG, 8 SS/TR, 9 GND hidden

## TPS82150
designator *  value TPS82150  Reference: U
ki_keywords: 17V 1A Step-down Buck Module; ki_description: 17V Input 1A Step-Down Converter MicroSiP Module with Integrated Inductor, μSiL-8; ki_fp_filters: Texas*MicroSiP*1EP*2.8x3mm*P0.65mm*; Footprint: Package_LGA:Texas_SIL0008D_MicroSiP-8-1EP_2.8x3mm_P0.65mm_EP1.1x1.9mm_ThermalVias; Datasheet: http://www.ti.com/lit/ds/symlink/tps82150.pdf
pins: 1 EN, 2 VIN, 3 GND, 4 VOUT, 5 VOUT hidden, 6 FB, 7 PG, 8 SS/TR, 9 GND hidden

## TPS560200
designator *  value TPS560200  Reference: U
ki_keywords: Voltage regulator switching buck fixed output analog; ki_description: 500mA, Synchronous Step-Down Converter With, Adjustable Output Voltage, 4.5-17V Input Voltage, SOT-23-5; ki_fp_filters: SOT?23*; Footprint: Package_TO_SOT_SMD:SOT-23-5; Datasheet: http://www.ti.com/lit/ds/symlink/tps560200.pdf
pins: 1 EN, 2 GND, 3 PH, 4 VIN, 5 FB

## TPS562200
designator *  value TPS562200  Reference: U
ki_keywords: step-down dcdc voltage regulator; ki_description: 2A Synchronous Step-Down Voltage Regulator, Adjustable Output Voltage, 4.5-17V Input Voltage, SOT-23-6; ki_fp_filters: SOT?23*; Footprint: Package_TO_SOT_SMD:SOT-23-6; Datasheet: http://www.ti.com/lit/ds/symlink/tps563200.pdf
pins: 1 GND, 2 SW, 3 VIN, 4 VFB, 5 EN, 6 VBST

## TPS563200
designator *  value TPS563200  Reference: U
ki_keywords: step-down dcdc voltage regulator; ki_description: 3A Synchronous Step-Down Voltage Regulator, Adjustable Output Voltage, 4.5-17V Input Voltage, SOT-23-6; ki_fp_filters: SOT?23*; Footprint: Package_TO_SOT_SMD:SOT-23-6; Datasheet: http://www.ti.com/lit/ds/symlink/tps563200.pdf
pins: 1 GND, 2 SW, 3 VIN, 4 VFB, 5 EN, 6 VBST

## TPS563202S
designator *  value TPS563202S  Reference: U
ki_keywords: step-down dcdc voltage regulator; ki_description: 3A Synchronous Step-Down Voltage Regulator, Adjustable Output Voltage, 4.3-17V Input Voltage, 0.806-7V Output Voltage, SOT-563; ki_fp_filters: SOT?563*; Footprint: Package_TO_SOT_SMD:SOT-563; Datasheet: https://www.ti.com/lit/ds/symlink/tps563202s.pdf
pins: 1 VIN, 2 SW, 3 GND, 4 BST, 5 EN, 6 FB

## TPS563240DDC
designator *  value TPS563240DDC  Reference: U
ki_keywords: step-down dcdc voltage regulator; ki_description: 3A Synchronous Step-Down Voltage Regulator, Adjustable Output Voltage, 4.5-17V Input Voltage, SOT-23-6; ki_fp_filters: SOT?23*; Footprint: Package_TO_SOT_SMD:SOT-23-6; Datasheet: www.ti.com/lit/ds/symlink/tps563240.pdf
pins: 1 GND, 2 SW, 3 VIN, 4 VFB, 5 EN, 6 VBST

## TPS565208
designator *  value TPS565208  Reference: U
ki_keywords: step-down dcdc voltage regulator; ki_description: 5A Synchronous Step-Down Voltage Regulator, Adjustable Output Voltage, 4.5-17V Input Voltage, SOT-23-6; ki_fp_filters: SOT?23*; Footprint: Package_TO_SOT_SMD:SOT-23-6; Datasheet: http://www.ti.com/lit/ds/symlink/tps565208.pdf
pins: 1 GND, 2 SW, 3 VIN, 4 VFB, 5 EN, 6 VBST